# Altium footprint library GyokuRe.PcbLib: 1248 footprints (part 55 of 78)
Each footprint in its own frame and in the unit in brackets; x right, y up, seen from the top. Pads: shape width x height; smd on the part's side, far side on the other; paste and mask are expansions set on the pad; w line width, h text height; cw(c..) or ccw(c..) is an arc to the next point about the centre after c.
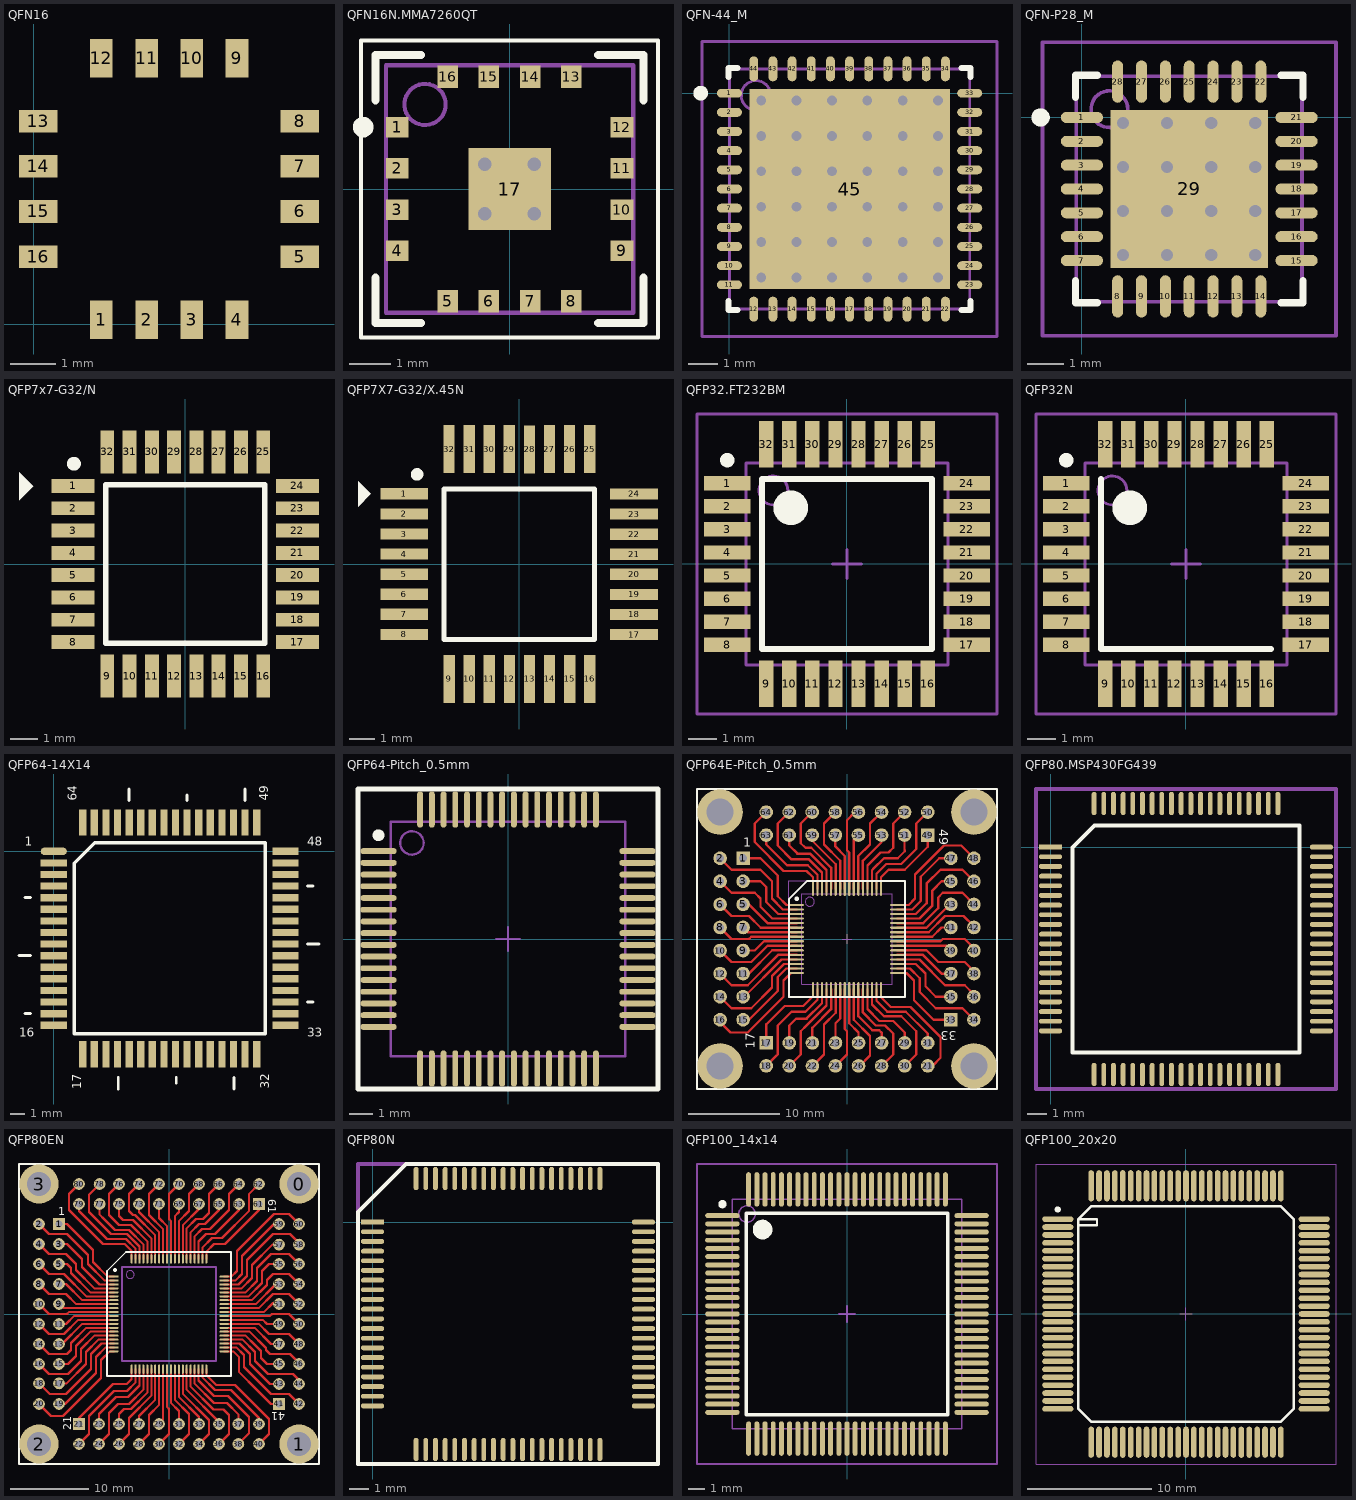
[diagram p54: the footprints below, top view; thin cyan lines are the x and y axes]

## QFN16 [mm] "QFN 16 LEAD 6x6mm"
height 2
pads (16):
  rect 0.5x0.85 smd: 1(1.5,0.104) 2(2.5,0.104) 3(3.5,0.104) 4(4.5,0.104) 9(4.5,5.89) 10(3.5,5.89) 11(2.5,5.89) 12(1.5,5.89)
  rect 0.85x0.5 smd: 5(5.89,1.5) 6(5.89,2.5) 7(5.89,3.5) 8(5.89,4.5) 13(0.1,4.5) 14(0.1,3.5) 15(0.1,2.5) 16(0.1,1.5)
3D body: height 0.8, standoff 0, extent 0,0 6,6

## QFN16N.MMA7260QT [mm] "QFN, 16-Leads, Body 6.0x6.0mm (max), Pitch 1.00mm, IPC Medium Density"
height 2
pads (17):
  rect 0.55x0.5 smd: 1(-2.725,1.5) 2(-2.725,0.5) 3(-2.725,-0.5) 4(-2.725,-1.5) 9(2.725,-1.5) 10(2.725,-0.5) 11(2.725,0.5) 12(2.725,1.5)
  rect 0.5x0.55 smd: 5(-1.5,-2.725) 6(-0.5,-2.725) 7(0.5,-2.725) 8(1.5,-2.725) 13(1.5,2.725) 14(0.5,2.725) 15(-0.5,2.725) 16(-1.5,2.725)
  rect 2x2 smd: 17(0,0)
via -0.6,0.6 diameter 0.66 hole 0.33
via 0.6,0.6 diameter 0.66 hole 0.33
via -0.6,-0.6 diameter 0.66 hole 0.33
via 0.6,-0.6 diameter 0.66 hole 0.33
Top Overlay:
  circle w0.25: c-3.55,1.5 r0.125
  lines w0.1: -3.6,-3.6 -3.6,3.6 3.6,3.6 3.6,-3.6 -3.6,-3.6
  lines w0.2: -3.25,-2.15 -3.25,-3.25 -2.15,-3.25 ; -3.25,2.15 -3.25,3.25 -2.15,3.25 ; 2.15,-3.25 3.25,-3.25 3.25,-2.15 ; 2.15,3.25 3.25,3.25 3.25,2.15
Mechanical 13:
  circle w0.1: c-2.05,2.05 r0.5
  lines w0.1: -3,-3 -3,3 3,3 3,-3 -3,-3
Mechanical 15:
  lines w0.1: -0.5,0 0.5,0 ; 0,-0.5 0,0.5
3D body: height 2, standoff 0.05, extent -3,-3 3,3
3D body: height 2.02, standoff 2, extent -2.534,1.547 -1.534,2.547
3D body: height 2.02, standoff 2, extent -0.875,1.075 0.375,1.85
3D body: height 2.02, standoff 2, extent -0.125,0.625 1.125,1.4
3D body: height 2.02, standoff 2, extent 0.692,0.213 1.942,0.988
3D body: height 2.02, standoff 2, extent -0.288,-0.434 0.962,0.341
3D body: height 2.02, standoff 2, extent -1.294,-1.104 -0.044,-0.329
3D body: height 2.02, standoff 2, extent 0.492,-0.853 1.742,-0.078
3D body: height 2.02, standoff 2, extent -0.494,-1.521 0.756,-0.746
3D body: height 2.02, standoff 2, extent -1.493,-2.187 -0.243,-1.412

## QFN-44_M [mm] "QFN, 44-Leads, Body 8x8 mm, Pitch 0.65mm, IPC Low Density"
height 1
pads (45):
  oval 0.85x0.3 smd: 1(0,0) 2(0,-0.65) 3(0,-1.3) 4(0,-1.95) 5(0,-2.6) 6(0,-3.25) 7(0,-3.9) 8(0,-4.55) 9(0,-5.2) 10(0,-5.85) 11(0,-6.5) 23(8.15,-6.5) 24(8.15,-5.85) 25(8.15,-5.2) 26(8.15,-4.55) 27(8.15,-3.9) 28(8.15,-3.25) 29(8.15,-2.6) 30(8.15,-1.95) 31(8.15,-1.3) 32(8.15,-0.65) 33(8.15,0)
  oval 0.3x0.85 smd: 12(0.825,-7.325) 13(1.475,-7.325) 14(2.125,-7.325) 15(2.775,-7.325) 16(3.425,-7.325) 17(4.075,-7.325) 18(4.725,-7.325) 19(5.375,-7.325) 20(6.025,-7.325) 21(6.675,-7.325) 22(7.325,-7.325) 34(7.325,0.825) 35(6.675,0.825) 36(6.025,0.825) 37(5.375,0.825) 38(4.725,0.825) 39(4.075,0.825) 40(3.425,0.825) 41(2.775,0.825) 42(2.125,0.825) 43(1.475,0.825) 44(0.825,0.825)
  rect 6.8x6.8 smd: 45(4.075,-3.25)
via 1.075,-0.25 diameter 0.66 hole 0.33
via 2.275,-0.25 diameter 0.66 hole 0.33
via 3.475,-0.25 diameter 0.66 hole 0.33
via 4.675,-0.25 diameter 0.66 hole 0.33
via 5.875,-0.25 diameter 0.66 hole 0.33
via 7.075,-0.25 diameter 0.66 hole 0.33
via 1.075,-1.45 diameter 0.66 hole 0.33
via 2.275,-1.45 diameter 0.66 hole 0.33
via 3.475,-1.45 diameter 0.66 hole 0.33
via 4.675,-1.45 diameter 0.66 hole 0.33
via 5.875,-1.45 diameter 0.66 hole 0.33
via 7.075,-1.45 diameter 0.66 hole 0.33
via 1.075,-2.65 diameter 0.66 hole 0.33
via 2.275,-2.65 diameter 0.66 hole 0.33
via 3.475,-2.65 diameter 0.66 hole 0.33
via 4.675,-2.65 diameter 0.66 hole 0.33
via 5.875,-2.65 diameter 0.66 hole 0.33
via 7.075,-2.65 diameter 0.66 hole 0.33
via 1.075,-3.85 diameter 0.66 hole 0.33
via 2.275,-3.85 diameter 0.66 hole 0.33
via 3.475,-3.85 diameter 0.66 hole 0.33
via 4.675,-3.85 diameter 0.66 hole 0.33
via 5.875,-3.85 diameter 0.66 hole 0.33
via 7.075,-3.85 diameter 0.66 hole 0.33
via 1.075,-5.05 diameter 0.66 hole 0.33
via 2.275,-5.05 diameter 0.66 hole 0.33
via 3.475,-5.05 diameter 0.66 hole 0.33
via 4.675,-5.05 diameter 0.66 hole 0.33
via 5.875,-5.05 diameter 0.66 hole 0.33
via 7.075,-5.05 diameter 0.66 hole 0.33
via 1.075,-6.25 diameter 0.66 hole 0.33
via 2.275,-6.25 diameter 0.66 hole 0.33
via 3.475,-6.25 diameter 0.66 hole 0.33
via 4.675,-6.25 diameter 0.66 hole 0.33
via 5.875,-6.25 diameter 0.66 hole 0.33
via 7.075,-6.25 diameter 0.66 hole 0.33
Top Overlay:
  circle w0.25: c-0.975,0 r0.125
  lines w0.2: -0.025,-7.05 -0.025,-7.35 0.275,-7.35 ; -0.025,0.55 -0.025,0.85 0.275,0.85 ; 7.875,-7.35 8.175,-7.35 8.175,-7.05 ; 7.875,0.85 8.175,0.85 8.175,0.55
Mechanical 13:
  circle w0.1: c0.9,-0.075 r0.5
  lines w0.1: 0,-7.325 0,0.825 8.15,0.825 8.15,-7.325 0,-7.325
Mechanical 15:
  lines w0.1: 3.575,-3.25 4.575,-3.25 ; 4.075,-3.75 4.075,-2.75 ; -0.925,-8.25 -0.925,1.75 9.075,1.75 9.075,-8.25 -0.925,-8.25
3D body: height 1, standoff 0, extent 0,-7.325 8.15,0.825

## QFN-P28_M [mm] "QFN, 28-Leads, Body 6x6 mm, Pitch 0.65mm, IPC Low Density"
height 1
pads (29):
  oval 1.15x0.3 smd: 1(0,0) 2(0,-0.65) 3(0,-1.3) 4(0,-1.95) 5(0,-2.6) 6(0,-3.25) 7(0,-3.9) 15(5.85,-3.9) 16(5.85,-3.25) 17(5.85,-2.6) 18(5.85,-1.95) 19(5.85,-1.3) 20(5.85,-0.65) 21(5.85,0)
  oval 0.3x1.15 smd: 8(0.975,-4.875) 9(1.625,-4.875) 10(2.275,-4.875) 11(2.925,-4.875) 12(3.575,-4.875) 13(4.225,-4.875) 14(4.875,-4.875) 22(4.875,0.975) 23(4.225,0.975) 24(3.575,0.975) 25(2.925,0.975) 26(2.275,0.975) 27(1.625,0.975) 28(0.975,0.975)
  rect 4.3x4.3 smd: 29(2.925,-1.95)
via 1.125,-0.15 diameter 0.66 hole 0.33
via 2.325,-0.15 diameter 0.66 hole 0.33
via 3.525,-0.15 diameter 0.66 hole 0.33
via 4.725,-0.15 diameter 0.66 hole 0.33
via 1.125,-1.35 diameter 0.66 hole 0.33
via 2.325,-1.35 diameter 0.66 hole 0.33
via 3.525,-1.35 diameter 0.66 hole 0.33
via 4.725,-1.35 diameter 0.66 hole 0.33
via 1.125,-2.55 diameter 0.66 hole 0.33
via 2.325,-2.55 diameter 0.66 hole 0.33
via 3.525,-2.55 diameter 0.66 hole 0.33
via 4.725,-2.55 diameter 0.66 hole 0.33
via 1.125,-3.75 diameter 0.66 hole 0.33
via 2.325,-3.75 diameter 0.66 hole 0.33
via 3.525,-3.75 diameter 0.66 hole 0.33
via 4.725,-3.75 diameter 0.66 hole 0.33
Top Overlay:
  circle w0.25: c-1.125,0 r0.125
  lines w0.2: -0.175,-4.45 -0.175,-5.05 0.425,-5.05 ; -0.175,0.55 -0.175,1.15 0.425,1.15 ; 5.425,-5.05 6.025,-5.05 6.025,-4.45 ; 5.425,1.15 6.025,1.15 6.025,0.55
Mechanical 13:
  circle w0.1: c0.75,0.225 r0.5
  lines w0.1: -0.15,-5.025 -0.15,1.125 6,1.125 6,-5.025 -0.15,-5.025
Mechanical 15:
  lines w0.1: 2.425,-1.95 3.425,-1.95 ; 2.925,-2.45 2.925,-1.45 ; -1.075,-5.95 -1.075,2.05 6.925,2.05 6.925,-5.95 -1.075,-5.95
3D body: height 1, standoff 0, extent -0.15,-5.025 6,1.125

## QFP7x7-G32/N [mm] "32-Pin Plastic Thin Quad Flat Pack (TFQP)"
height 1.2
pads (32):
  rect 1.55x0.5 smd: 1(-4.025,2.8) 2(-4.025,2) 3(-4.025,1.2) 4(-4.025,0.4) 5(-4.025,-0.4) 6(-4.025,-1.2) 7(-4.025,-2) 8(-4.025,-2.8) 17(4.025,-2.8) 18(4.025,-2) 19(4.025,-1.2) 20(4.025,-0.4) 21(4.025,0.4) 22(4.025,1.2) 23(4.025,2) 24(4.025,2.8)
  rect 0.5x1.55 smd: 9(-2.8,-4.025) 10(-2,-4.025) 11(-1.2,-4.025) 12(-0.4,-4.025) 13(0.4,-4.025) 14(1.2,-4.025) 15(2,-4.025) 16(2.8,-4.025) 25(2.8,4.025) 26(2,4.025) 27(1.2,4.025) 28(0.4,4.025) 29(-0.4,4.025) 30(-1.2,4.025) 31(-2,4.025) 32(-2.8,4.025)
Top Overlay:
  circle w0.25: c-4,3.6 r0.125
  region: -5.969,3.302 -5.461,2.794 -5.969,2.286
  lines w0.2: -2.85,-2.85 -2.85,2.85 2.85,2.85 2.85,-2.85 -2.85,-2.85

## QFP7X7-G32/X.45N [mm] "QFP; 32 Leads; Body 7 x 7 mm; Pitch 0.8 mm"
height 1.6
pads (32):
  rect 1.905x0.45 smd: 1(-4.583,2.8) 2(-4.583,2) 3(-4.583,1.2) 4(-4.583,0.4) 5(-4.583,-0.4) 6(-4.583,-1.2) 7(-4.583,-2) 8(-4.583,-2.8) 17(4.572,-2.806) 18(4.572,-2.006) 19(4.572,-1.206) 20(4.572,-0.406) 21(4.572,0.394) 22(4.572,1.194) 23(4.572,1.994) 24(4.572,2.794)
  rect 0.45x1.905 smd: 9(-2.794,-4.572) 10(-1.994,-4.572) 11(-1.194,-4.572) 12(-0.394,-4.572) 13(0.406,-4.572) 14(1.206,-4.572) 15(2.006,-4.572) 16(2.806,-4.572) 25(2.8,4.583) 26(2,4.583) 27(1.2,4.583) 28(0.406,4.572) 29(-0.4,4.583) 30(-1.2,4.583) 31(-2,4.583) 32(-2.8,4.583)
Top Overlay:
  circle w0.25: c-4.075,3.575 r0.125
  region: -6.426,3.302 -5.918,2.794 -6.426,2.286
  lines w0.2: -3,-3 3,-3 3,3 -3,3 -3,-3
3D body "Atmega8.step": height 1.13, standoff 0.02, extent -4.743,-4.857 4.857,4.743

## QFP32.FT232BM [mm] "QFP, 32-Leads, Body 9x9mm, Pitch 0.8mm, IPC Medium Density"
height 1.6
pads (32):
  rect 1.6x0.5 smd: 1(-4.15,2.8) 2(-4.15,2) 3(-4.15,1.2) 4(-4.15,0.4) 5(-4.15,-0.4) 6(-4.15,-1.2) 7(-4.15,-2) 8(-4.15,-2.8) 17(4.15,-2.8) 18(4.15,-2) 19(4.15,-1.2) 20(4.15,-0.4) 21(4.15,0.4) 22(4.15,1.2) 23(4.15,2) 24(4.15,2.8)
  rect 0.5x1.6 smd: 9(-2.8,-4.15) 10(-2,-4.15) 11(-1.2,-4.15) 12(-0.4,-4.15) 13(0.4,-4.15) 14(1.2,-4.15) 15(2,-4.15) 16(2.8,-4.15) 25(2.8,4.15) 26(2,4.15) 27(1.2,4.15) 28(0.4,4.15) 29(-0.4,4.15) 30(-1.2,4.15) 31(-2,4.15) 32(-2.8,4.15)
Top Overlay:
  circle w0.6: c-1.95,1.95 r0.3
  circle w0.25: c-4.15,3.6 r0.125
  lines w0.2: -2.95,-2.95 2.95,-2.95 2.95,2.95 -2.95,2.95 -2.95,-2.95
Mechanical 13:
  circle w0.1: c-2.55,2.55 r0.5
  circle w0.1: c-2.55,2.55 r0.5
  lines w0.1: -3.5,-3.5 3.5,-3.5 3.5,3.5 -3.5,3.5 -3.5,-3.5
Mechanical 15:
  lines w0.1: -0.5,0 0.5,0 ; 0,-0.5 0,0.5 ; -5.2,-5.2 5.2,-5.2 5.2,5.2 -5.2,5.2 -5.2,-5.2
3D body: height 0.15, standoff 0, extent -4.45,2.6 -3.45,3
3D body: height 0.15, standoff 0, extent -4.45,1.8 -3.45,2.2
3D body: height 0.15, standoff 0, extent -4.45,1 -3.45,1.4
3D body: height 0.15, standoff 0, extent -4.45,0.2 -3.45,0.6
3D body: height 0.15, standoff 0, extent -4.45,-0.6 -3.45,-0.2
3D body: height 0.15, standoff 0, extent -4.45,-1.4 -3.45,-1
3D body: height 0.15, standoff 0, extent -4.45,-2.2 -3.45,-1.8
3D body: height 0.15, standoff 0, extent -4.45,-3 -3.45,-2.6
3D body: height 0.15, standoff 0, extent -3,-4.45 -2.6,-3.45
3D body: height 0.15, standoff 0, extent -2.2,-4.45 -1.8,-3.45
3D body: height 0.15, standoff 0, extent -1.4,-4.45 -1,-3.45
3D body: height 0.15, standoff 0, extent -0.6,-4.45 -0.2,-3.45
3D body: height 0.15, standoff 0, extent 0.2,-4.45 0.6,-3.45
3D body: height 0.15, standoff 0, extent 1,-4.45 1.4,-3.45
3D body: height 0.15, standoff 0, extent 1.8,-4.45 2.2,-3.45
3D body: height 0.15, standoff 0, extent 2.6,-4.45 3,-3.45
3D body: height 0.15, standoff 0, extent 3.45,-3 4.45,-2.6
3D body: height 0.15, standoff 0, extent 3.45,-2.2 4.45,-1.8
3D body: height 0.15, standoff 0, extent 3.45,-1.4 4.45,-1
3D body: height 0.15, standoff 0, extent 3.45,-0.6 4.45,-0.2
3D body: height 0.15, standoff 0, extent 3.45,0.2 4.45,0.6
3D body: height 0.15, standoff 0, extent 3.45,1 4.45,1.4
3D body: height 0.15, standoff 0, extent 3.45,1.8 4.45,2.2
3D body: height 0.15, standoff 0, extent 3.45,2.6 4.45,3
3D body: height 0.15, standoff 0, extent 2.6,3.45 3,4.45
3D body: height 0.15, standoff 0, extent 1.8,3.45 2.2,4.45
3D body: height 0.15, standoff 0, extent 1,3.45 1.4,4.45
3D body: height 0.15, standoff 0, extent 0.2,3.45 0.6,4.45
3D body: height 0.15, standoff 0, extent -0.6,3.45 -0.2,4.45
3D body: height 0.15, standoff 0, extent -1.4,3.45 -1,4.45
3D body: height 0.15, standoff 0, extent -2.2,3.45 -1.8,4.45
3D body: height 0.15, standoff 0, extent -3,3.45 -2.6,4.45
3D body: height 1.6, standoff 1.6, extent -3.04,2.048 -2.04,3.048
3D body: height 1.6, standoff 0.15, extent -3.5,-3.5 3.5,3.5

## QFP32N [mm] "QFP, 32-Leads, Body 9x9mm, Pitch 0.8mm, IPC Medium Density"
height 1.6
pads (32):
  rect 1.6x0.5 smd: 1(-4.15,2.8) 2(-4.15,2) 3(-4.15,1.2) 4(-4.15,0.4) 5(-4.15,-0.4) 6(-4.15,-1.2) 7(-4.15,-2) 8(-4.15,-2.8) 17(4.15,-2.8) 18(4.15,-2) 19(4.15,-1.2) 20(4.15,-0.4) 21(4.15,0.4) 22(4.15,1.2) 23(4.15,2) 24(4.15,2.8)
  rect 0.5x1.6 smd: 9(-2.8,-4.15) 10(-2,-4.15) 11(-1.2,-4.15) 12(-0.4,-4.15) 13(0.4,-4.15) 14(1.2,-4.15) 15(2,-4.15) 16(2.8,-4.15) 25(2.8,4.15) 26(2,4.15) 27(1.2,4.15) 28(0.4,4.15) 29(-0.4,4.15) 30(-1.2,4.15) 31(-2,4.15) 32(-2.8,4.15)
Top Overlay:
  circle w0.25: c-4.15,3.6 r0.125
  circle w0.6: c-1.95,1.95 r0.3
  lines w0.2: -2.95,2.95 -2.95,-2.95 2.95,-2.95
Mechanical 13:
  circle w0.1: c-2.55,2.55 r0.5
  circle w0.1: c-2.55,2.55 r0.5
  lines w0.1: -3.5,-3.5 -3.5,3.5 3.5,3.5 3.5,-3.5 -3.5,-3.5
Mechanical 15:
  lines w0.1: -0.5,0 0.5,0 ; 0,-0.5 0,0.5 ; -5.2,-5.2 -5.2,5.2 5.2,5.2 5.2,-5.2 -5.2,-5.2
3D body "TQFP-32.STEP": height 1.4, standoff -0.06, extent -4.5,-4.5 4.5,4.5

## QFP64-14X14 [mm] "pitch : 0.8mm, 14x14x1mm body"
pads (64):
  oval 1.8x0.5 smd: 1(0,0)
  rect 1.8x0.5 smd: 2(0,-0.8) 3(0,-1.6) 4(0,-2.4) 5(0,-3.2) 6(0,-4) 7(0,-4.8) 8(0,-5.6) 9(0,-6.4) 10(0,-7.2) 11(0,-8) 12(0,-8.8) 13(0,-9.6) 14(0,-10.4) 15(0,-11.2) 16(0,-12) 33(16,-12) 34(16,-11.2) 35(16,-10.4) 36(16,-9.6) 37(16,-8.8) 38(16,-8) 39(16,-7.2) 40(16,-6.4) 41(16,-5.6) 42(16,-4.8) 43(16,-4) 44(16,-3.2) 45(16,-2.4) 46(16,-1.6) 47(16,-0.8) 48(16,0)
  rect 0.5x1.8 smd: 17(2,-14) 18(2.8,-14) 19(3.6,-14) 20(4.4,-14) 21(5.2,-14) 22(6,-14) 23(6.8,-14) 24(7.6,-14) 25(8.4,-14) 26(9.2,-14) 27(10,-14) 28(10.8,-14) 29(11.6,-14) 30(12.4,-14) 31(13.2,-14) 32(14,-14) 49(14,2) 50(13.2,2) 51(12.4,2) 52(11.6,2) 53(10.8,2) 54(10,2) 55(9.2,2) 56(8.4,2) 57(7.6,2) 58(6.8,2) 59(6,2) 60(5.2,2) 61(4.4,2) 62(3.6,2) 63(2.8,2) 64(2,2)
Top Overlay:
  lines w0.203: -2.4,-7.2 -1.6,-7.2 ; -2,-11.2 -1.6,-11.2 ; -2,-3.2 -1.6,-3.2 ; 4.45,-16.4 4.45,-15.6 ; 5.2,3.5 5.2,4.3 ; 8.45,-16 8.45,-15.6 ; 9.2,3.5 9.2,3.9 ; 12.45,-16.4 12.45,-15.6 ; 13.2,3.5 13.2,4.3 ; 17.5,-10.4 17.9,-10.4 ; 17.5,-6.4 18.3,-6.4 ; 17.5,-2.4 17.9,-2.4
  lines w0.25: 1.41,-12.59 1.41,-0.82 2.82,0.59 14.59,0.59 14.59,-12.59 1.41,-12.59
  text "64" at 1.6,3.5 h0.61
  text "49" at 14.8,3.5 h0.61
  text "48" at 17.5,0.4 h0.61
  text "33" at 17.5,-12.8 h0.61
  text "32" at 14.85,-16.4 h0.61
  text "17" at 1.9,-16.4 h0.61
  text "16" at -2.4,-12.8 h0.61
  text "1" at -2,0.4 h0.61

## QFP64-Pitch_0.5mm [mm] "64-Pin Thin Quad Flat Pack 10x10x1mm body, 0.5 mm Pitch, IPC High Density"
height 1.6
pads (64):
  oval 1.55x0.25 smd: 1(-5.525,3.75) 2(-5.525,3.25) 3(-5.525,2.75) 4(-5.525,2.25) 5(-5.525,1.75) 6(-5.525,1.25) 7(-5.525,0.75) 8(-5.525,0.25) 9(-5.525,-0.25) 10(-5.525,-0.75) 11(-5.525,-1.25) 12(-5.525,-1.75) 13(-5.525,-2.25) 14(-5.525,-2.75) 15(-5.525,-3.25) 16(-5.525,-3.75) 33(5.525,-3.75) 34(5.525,-3.25) 35(5.525,-2.75) 36(5.525,-2.25) 37(5.525,-1.75) 38(5.525,-1.25) 39(5.525,-0.75) 40(5.525,-0.25) 41(5.525,0.25) 42(5.525,0.75) 43(5.525,1.25) 44(5.525,1.75) 45(5.525,2.25) 46(5.525,2.75) 47(5.525,3.25) 48(5.525,3.75)
  oval 0.25x1.55 smd: 17(-3.75,-5.525) 18(-3.25,-5.525) 19(-2.75,-5.525) 20(-2.25,-5.525) 21(-1.75,-5.525) 22(-1.25,-5.525) 23(-0.75,-5.525) 24(-0.25,-5.525) 25(0.25,-5.525) 26(0.75,-5.525) 27(1.25,-5.525) 28(1.75,-5.525) 29(2.25,-5.525) 30(2.75,-5.525) 31(3.25,-5.525) 32(3.75,-5.525) 49(3.75,5.525) 50(3.25,5.525) 51(2.75,5.525) 52(2.25,5.525) 53(1.75,5.525) 54(1.25,5.525) 55(0.75,5.525) 56(0.25,5.525) 57(-0.25,5.525) 58(-0.75,5.525) 59(-1.25,5.525) 60(-1.75,5.525) 61(-2.25,5.525) 62(-2.75,5.525) 63(-3.25,5.525) 64(-3.75,5.525)
Top Overlay:
  circle w0.25: c-5.525,4.425 r0.125
  lines w0.2: -6.4,-6.4 6.4,-6.4 6.4,6.4 -6.4,6.4 -6.4,-6.4
Mechanical 13:
  circle w0.1: c-4.1,4.1 r0.5
  lines w0.1: -5,-5 5,-5 5,5 -5,5 -5,-5
Mechanical 15:
  lines w0.1: -0.5,0 0.5,0 ; 0,-0.5 0,0.5 ; -6.4,-6.4 6.4,-6.4 6.4,6.4 -6.4,6.4 -6.4,-6.4
3D body: height 1.6, standoff 0, extent -5,-5 5,5

## QFP64E-Pitch_0.5mm [mm] "64-Pin Thin Quad Flat Pack 10x10x1mm body, 0.5 mm Pitch, IPC High Density"
height 1.6
pads (132):
  rect 1.5x1.5 hole 0.9: 1(-11.43,8.89) 17(-8.89,-11.43) 33(11.43,-8.89) 49(8.89,11.43)
  oval 1.55x0.25 smd: 1(-5.525,3.75) 2(-5.525,3.25) 3(-5.525,2.75) 4(-5.525,2.25) 5(-5.525,1.75) 6(-5.525,1.25) 7(-5.525,0.75) 8(-5.525,0.25) 9(-5.525,-0.25) 10(-5.525,-0.75) 11(-5.525,-1.25) 12(-5.525,-1.75) 13(-5.525,-2.25) 14(-5.525,-2.75) 15(-5.525,-3.25) 16(-5.525,-3.75) 33(5.525,-3.75) 34(5.525,-3.25) 35(5.525,-2.75) 36(5.525,-2.25) 37(5.525,-1.75) 38(5.525,-1.25) 39(5.525,-0.75) 40(5.525,-0.25) 41(5.525,0.25) 42(5.525,0.75) 43(5.525,1.25) 44(5.525,1.75) 45(5.525,2.25) 46(5.525,2.75) 47(5.525,3.25) 48(5.525,3.75)
  round 1.5 hole 0.9: 2(-13.97,8.89) 3(-11.43,6.35) 4(-13.97,6.35) 5(-11.43,3.81) 6(-13.97,3.81) 7(-11.43,1.27) 8(-13.97,1.27) 9(-11.43,-1.27) 10(-13.97,-1.27) 11(-11.43,-3.81) 12(-13.97,-3.81) 13(-11.43,-6.35) 14(-13.97,-6.35) 15(-11.43,-8.89) 16(-13.97,-8.89) 18(-8.89,-13.97) 19(-6.35,-11.43) 20(-6.35,-13.97) 21(-3.81,-11.43) 21(8.89,-13.97) 22(-3.81,-13.97) 23(-1.27,-11.43) 24(-1.27,-13.97) 25(1.27,-11.43) 26(1.27,-13.97) 27(3.81,-11.43) 28(3.81,-13.97) 29(6.35,-11.43) 30(6.35,-13.97) 31(8.89,-11.43) 34(13.97,-8.89) 35(11.43,-6.35) 36(13.97,-6.35) 37(11.43,-3.81) 38(13.97,-3.81) 39(11.43,-1.27) 40(13.97,-1.27) 41(11.43,1.27) 42(13.97,1.27) 43(11.43,3.81) 44(13.97,3.81) 45(11.43,6.35) 46(13.97,6.35) 47(11.43,8.89) 48(13.97,8.89) 50(8.89,13.97) 51(6.339,11.431) 52(6.339,13.971) 53(3.799,11.431) 54(3.799,13.971) 55(1.259,11.431) 56(1.259,13.971) 57(-1.281,11.431) 58(-1.281,13.971) 59(-3.821,11.431) 60(-3.821,13.971) 61(-6.361,11.431) 62(-6.361,13.971) 63(-8.89,11.43) 64(-8.89,13.97)
  oval 0.25x1.55 smd: 17(-3.75,-5.525) 18(-3.25,-5.525) 19(-2.75,-5.525) 20(-2.25,-5.525) 21(-1.75,-5.525) 22(-1.25,-5.525) 23(-0.75,-5.525) 24(-0.25,-5.525) 25(0.25,-5.525) 26(0.75,-5.525) 27(1.25,-5.525) 28(1.75,-5.525) 29(2.25,-5.525) 30(2.75,-5.525) 31(3.25,-5.525) 32(3.75,-5.525) 49(3.75,5.525) 50(3.25,5.525) 51(2.75,5.525) 52(2.25,5.525) 53(1.75,5.525) 54(1.25,5.525) 55(0.75,5.525) 56(0.25,5.525) 57(-0.25,5.525) 58(-0.75,5.525) 59(-1.25,5.525) 60(-1.75,5.525) 61(-2.25,5.525) 62(-2.75,5.525) 63(-3.25,5.525) 64(-3.75,5.525)
  round 5 hole 3: ""(-13.97,-13.97) ""(-13.97,13.97) ""(13.97,-13.97) ""(13.97,13.97)
Top Layer:
  lines w0.254: -13.97,-8.89 -13.97,-9.144 -12.827,-10.287 -10.922,-10.287 -6.985,-6.35 -6.985,-4.572 -6.163,-3.75 -5.525,-3.75 -6.29,-3.75 ; -13.97,-6.35 -12.7,-7.62 -10.541,-7.62 -8.255,-5.334 -8.255,-4.064 -6.941,-2.75 -5.525,-2.75 ; -13.97,-3.81 -12.7,-5.08 -10.922,-5.08 -7.592,-1.75 -5.525,-1.75 ; -13.97,-1.27 -12.7,-2.54 -10.541,-2.54 -8.751,-0.75 -5.525,-0.75 ; -13.97,1.27 -12.7,0 -10.795,0 -10.545,0.25 -5.525,0.25 ; -13.97,3.81 -12.7,2.54 -10.795,2.54 -9.505,1.25 -8.87,1.25 -5.525,1.25 ; -13.97,6.35 -12.7,5.08 -10.16,5.08 -9.525,4.445 -9.525,3.556 -8.219,2.25 -5.525,2.25 ; -13.97,8.89 -12.7,7.62 -9.525,7.62 -8.255,6.35 -8.255,4.445 -7.06,3.25 -5.525,3.25 ; -11.43,-8.89 -10.795,-8.89 -7.62,-5.715 -7.62,-4.191 -6.679,-3.25 -5.525,-3.25 ; -11.43,-6.35 -11.303,-6.35 -7.203,-2.25 -5.525,-2.25 ; -11.43,-3.81 -10.795,-3.81 -8.235,-1.25 -5.525,-1.25 ; -11.43,-1.27 -10.16,-1.27 -9.14,-0.25 -5.525,-0.25 ; -11.43,1.27 -10.91,0.75 -5.525,0.75 ; -11.43,3.81 -10.795,3.81 -8.735,1.75 -5.525,1.75 ; -11.43,6.35 -9.525,6.35 -8.89,5.715 -8.89,4.064 -7.576,2.75 -5.525,2.75 ; -11.43,8.89 -9.525,8.89 -7.62,6.985 -7.62,4.699 -6.671,3.75 -5.525,3.75 ; -8.89,-11.43 -8.89,-9.398 -6.858,-7.366 -4.826,-7.366 -3.75,-6.29 -3.75,-5.525 ; -8.89,11.43 -8.89,10.414 -6.604,8.128 -4.318,8.128 -3.25,7.06 -3.25,5.525 ; -8.89,13.97 -10.16,12.7 -10.16,10.668 -6.985,7.493 -4.445,7.493 -3.75,6.798 -3.75,5.525 ; -7.747,-12.827 -8.89,-13.97 -7.62,-12.7 -7.62,-9.525 -6.096,-8.001 -4.572,-8.001 -3.25,-6.679 -3.25,-5.525 ; -6.361,11.431 -6.361,10.298 -5.461,9.398 -4.064,9.398 -2.25,7.584 -2.25,5.207 ; -6.361,13.971 -7.62,12.712 -7.62,10.287 -6.096,8.763 -4.191,8.763 -2.75,7.322 -2.75,5.525 ; -6.35,-13.97 -5.08,-12.7 -5.08,-10.16 -4.445,-9.525 -2.25,-7.33 -2.25,-5.525 ; -6.35,-11.43 -6.35,-9.525 -5.588,-8.763 -4.445,-8.763 -2.75,-7.068 -2.75,-5.525 ; -3.821,11.431 -3.821,10.806 -1.25,8.235 -1.25,7.854 -1.25,5.525 ; -3.821,13.971 -5.08,12.712 -5.08,10.541 -4.572,10.033 -3.937,10.033 -1.75,7.846 -1.75,7.354 -1.75,5.525 ; -3.81,-13.97 -2.54,-12.7 -2.54,-9.398 -1.25,-8.108 -1.25,-5.525 ; -3.81,-11.43 -3.81,-9.779 -1.75,-7.719 -1.75,-5.525 ; -1.281,11.431 -1.281,10.171 -0.25,9.14 -0.25,7.124 -0.25,5.525 ; -1.281,13.971 -2.54,12.712 -2.54,10.414 -0.75,8.624 -0.75,7.862 -0.75,5.525 ; -1.27,-13.97 0,-12.7 0,-10.16 -0.25,-9.91 -0.25,-5.525 ; -1.27,-11.43 -1.27,-9.271 -0.75,-8.751 -0.75,-5.525 ; 0.25,-5.525 0.25,-9.267 1.27,-10.287 1.27,-11.43 ; 0.25,5.525 0.25,7.624 0.25,9.529 0,9.779 0,13.081 0.89,13.971 1.259,13.971 1.017,13.971 0.75,13.704 ; 0.75,-5.525 0.75,-8.878 2.54,-10.668 2.54,-12.827 1.397,-13.97 1.27,-13.97 ; 0.75,5.525 0.75,7.378 0.75,10.922 1.259,11.431 ; 1.25,-5.525 1.25,-8.489 2.794,-10.033 3.556,-10.033 3.81,-10.287 3.81,-11.43 ; 1.25,5.525 1.25,7.473 1.25,9.124 2.54,10.414 2.54,12.7 3.799,13.959 3.799,13.971 ; 1.75,-5.525 1.75,-8.1 3.175,-9.525 4.191,-9.525 5.08,-10.414 5.08,-12.7 3.81,-13.97 ; 1.75,5.525 1.75,6.775 1.75,8.608 3.799,10.657 3.799,11.431 ; 2.25,-5.525 2.25,-7.711 3.556,-9.017 5.08,-9.017 6.35,-10.287 6.35,-11.43 ; 2.25,5.525 2.25,7.275 2.25,8.092 3.683,9.525 4.572,9.525 5.08,10.033 5.08,12.7 6.35,13.97 ; 2.75,-5.525 2.75,-7.195 4.064,-8.509 5.969,-8.509 7.62,-10.16 7.62,-12.7 6.35,-13.97 ; 2.75,5.525 2.75,7.493 2.75,7.576 2.921,7.747 4.064,8.89 5.588,8.89 6.35,9.652 6.35,9.779 ; 3.25,-5.525 3.25,-6.806 4.445,-8.001 6.477,-8.001 8.89,-10.414 8.89,-11.43 ; 3.25,5.525 3.25,7.187 4.318,8.255 5.969,8.255 7.62,9.906 7.62,12.7 8.89,13.97 ; 3.75,-5.525 3.75,-6.417 4.826,-7.493 6.985,-7.493 10.287,-10.795 10.287,-13.081 9.398,-13.97 8.89,-13.97 ; 3.75,5.525 3.75,6.798 4.572,7.62 6.35,7.62 8.89,10.16 8.89,11.43 ; 5.525,-3.75 6.544,-3.75 7.366,-4.572 7.366,-6.731 9.525,-8.89 11.43,-8.89 ; 5.525,-3.25 6.933,-3.25 8.001,-4.318 8.001,-5.842 9.779,-7.62 12.7,-7.62 13.97,-8.89 ; 5.525,-2.75 7.576,-2.75 8.636,-3.81 8.636,-5.207 9.779,-6.35 11.43,-6.35 ; 5.525,-2.25 7.965,-2.25 10.795,-5.08 12.954,-5.08 13.97,-6.096 13.97,-6.35 ; 5.525,-1.75 8.354,-1.75 10.414,-3.81 11.43,-3.81 ; 5.525,-1.25 8.743,-1.25 10.033,-2.54 12.954,-2.54 13.97,-3.556 13.97,-3.81 ; 5.525,-0.75 10.91,-0.75 11.43,-1.27 ; 5.525,-0.25 10.291,-0.25 10.541,0 12.954,0 13.97,-1.016 13.97,-1.27 ; 5.525,0.25 8.124,0.25 9.394,0.25 10.414,1.27 11.43,1.27 ; 5.525,0.75 9.005,0.75 10.795,2.54 12.827,2.54 13.97,1.397 13.97,1.27 ; 5.525,1.25 8.743,1.25 11.303,3.81 11.43,3.81 ; 5.525,1.75 8.382,1.75 10.033,3.401 10.033,4.572 10.541,5.08 11.303,5.08 ; 5.525,2.25 7.965,2.25 9.398,3.683 9.398,5.334 10.414,6.35 11.43,6.35 ; 5.525,2.75 7.576,2.75 8.763,3.937 8.763,6.096 10.287,7.62 12.7,7.62 13.97,6.35 ; 5.525,3.25 7.187,3.25 8.128,4.191 8.128,6.858 10.16,8.89 11.43,8.89 ; 5.525,3.75 6.798,3.75 7.493,4.445 7.493,7.112 10.668,10.287 12.573,10.287 13.97,8.89 ; 6.339,9.641 6.339,11.431 ; 11.049,5.08 12.7,5.08 13.97,3.81